# Altium footprint library ACTION_IC封装.PcbLib: 114 footprints (part 8 of 8)
Each footprint in its own frame and in the unit in brackets; x right, y up, seen from the top. Pads: shape width x height; smd on the part's side, far side on the other; paste and mask are expansions set on the pad; w line width, h text height; cw(c..) or ccw(c..) is an arc to the next point about the centre after c.
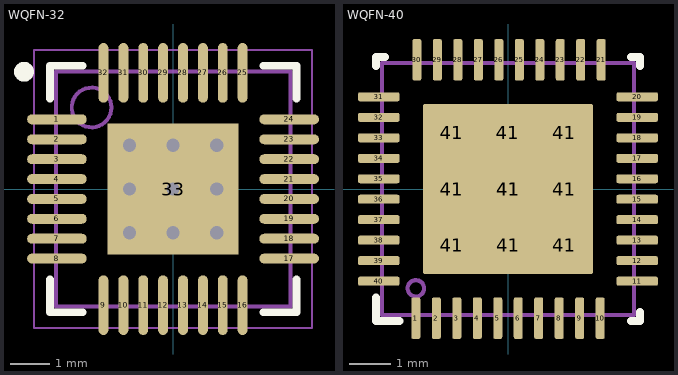
[diagram p7: the footprints below, top view; thin cyan lines are the x and y axes]

## WQFN-32 [mm] "QFN, 32-Leads, Body 5.85x5.85mm, Pitch 0.50mm, Thermal Pad 3.45x3.45mm, IPC Medium Density"
height 0.8
pads (33):
  oval 1.5x0.25 smd: 1(-2.921,1.753) 2(-2.921,1.25) 3(-2.921,0.75) 4(-2.921,0.25) 5(-2.921,-0.25) 6(-2.921,-0.75) 7(-2.921,-1.25) 8(-2.921,-1.75) 17(2.921,-1.75) 18(2.921,-1.25) 19(2.921,-0.75) 20(2.921,-0.25) 21(2.921,0.25) 22(2.921,0.75) 23(2.921,1.25) 24(2.921,1.753)
  oval 0.25x1.5 smd: 9(-1.753,-2.921) 10(-1.25,-2.921) 11(-0.75,-2.921) 12(-0.25,-2.921) 13(0.25,-2.921) 14(0.75,-2.921) 15(1.25,-2.921) 16(1.75,-2.921) 25(1.75,2.921) 26(1.25,2.921) 27(0.75,2.921) 28(0.25,2.921) 29(-0.25,2.921) 30(-0.75,2.921) 31(-1.25,2.921) 32(-1.753,2.921)
  rect 3.3x3.3 smd: 33(0,0)
via -1.1,1.1 diameter 0.508 hole 0.33
via 0,1.1 diameter 0.508 hole 0.33
via 1.1,1.1 diameter 0.508 hole 0.33
via -1.1,0 diameter 0.508 hole 0.33
via 0,0 diameter 0.508 hole 0.33
via 1.1,0 diameter 0.508 hole 0.33
via -1.1,-1.1 diameter 0.508 hole 0.33
via 0,-1.1 diameter 0.508 hole 0.33
via 1.1,-1.1 diameter 0.508 hole 0.33
Top Overlay:
  circle w0.25: c-3.75,2.95 r0.125
  lines w0.2: -3.1,-2.275 -3.1,-3.1 -2.275,-3.1 ; -3.1,2.275 -3.1,3.1 -2.275,3.1 ; 2.275,-3.1 3.1,-3.1 3.1,-2.275 ; 2.275,3.1 3.1,3.1 3.1,2.275
Mechanical 13:
  circle w0.1: c-2.05,2.05 r0.5
  lines w0.1: -2.95,-2.95 -2.95,2.95 2.95,2.95 2.95,-2.95 -2.95,-2.95
Mechanical 15:
  lines w0.05: -3.5,-3.5 -3.5,3.5 3.5,3.5 3.5,-3.5 -3.5,-3.5
  lines w0.1: -0.5,0 0.5,0 ; 0,-0.5 0,0.5
3D body: height 0.8, standoff 0.01, extent -2.95,-2.95 2.95,2.95

## WQFN-40 [mm] "QFN, 40-Leads, Body 6.80x6.80mm, Pitch 0.50mm, Thermal Pad 4.10x4.10mm, IPC Medium Density"
height 1
pads (50):
  rrect45% 0.22x1.016 smd mask+0.07: 1(-2.25,-3.154) 2(-1.75,-3.154) 3(-1.25,-3.154) 4(-0.75,-3.154) 5(-0.25,-3.154) 6(0.25,-3.154) 7(0.75,-3.154) 8(1.25,-3.154) 9(1.75,-3.154) 10(2.25,-3.154) 21(2.275,3.154) 22(1.775,3.154) 23(1.275,3.154) 24(0.775,3.154) 25(0.275,3.154) 26(-0.225,3.154) 27(-0.725,3.154) 28(-1.225,3.154) 29(-1.725,3.154) 30(-2.225,3.154)
  rrect45% 1.016x0.22 smd mask+0.07: 11(3.154,-2.25) 12(3.154,-1.75) 13(3.154,-1.25) 14(3.154,-0.75) 15(3.154,-0.25) 16(3.154,0.25) 17(3.154,0.75) 18(3.154,1.25) 19(3.154,1.75) 20(3.154,2.25) 31(-3.154,2.25) 32(-3.154,1.75) 33(-3.154,1.25) 34(-3.154,0.75) 35(-3.154,0.25) 36(-3.154,-0.25) 37(-3.154,-0.75) 38(-3.154,-1.25) 39(-3.154,-1.75) 40(-3.154,-2.25)
  rrect9% 1.17x1.17 on Top Paste: 41(-1.37,-1.37) 41(-1.37,0) 41(-1.37,1.37) 41(0,1.37) 41(0,-1.37) 41(0,0) 41(1.37,0) 41(1.37,-1.37) 41(1.37,1.37)
  rrect2% 4.15x4.15 smd paste-2.1: 41(0,0)
Top Overlay:
  lines w0.2: -3.225,-2.65 -3.225,-3.225 -2.65,-3.225 ; -3.225,3 -3.225,3.225 -3,3.225 ; 3,-3.225 3.225,-3.225 3.225,-3 ; 3,3.225 3.225,3.225 3.225,3
Mechanical 5:
  circle w0.1: c-2.25,-2.425 r0.2
  lines w0.1: -3.075,-3.075 -3.075,3.075 3.075,3.075 3.075,-3.075 -3.075,-3.075
3D body "RHA0040B.stp": height 1, standoff 0, extent -3,-3 3,3